# Altium footprint library 2.52-直插元件.PcbLib: 163 footprints (part 8 of 11)
Each footprint in its own frame and in the unit in brackets; x right, y up, seen from the top. Pads: shape width x height; smd on the part's side, far side on the other; paste and mask are expansions set on the pad; w line width, h text height; cw(c..) or ccw(c..) is an arc to the next point about the centre after c.
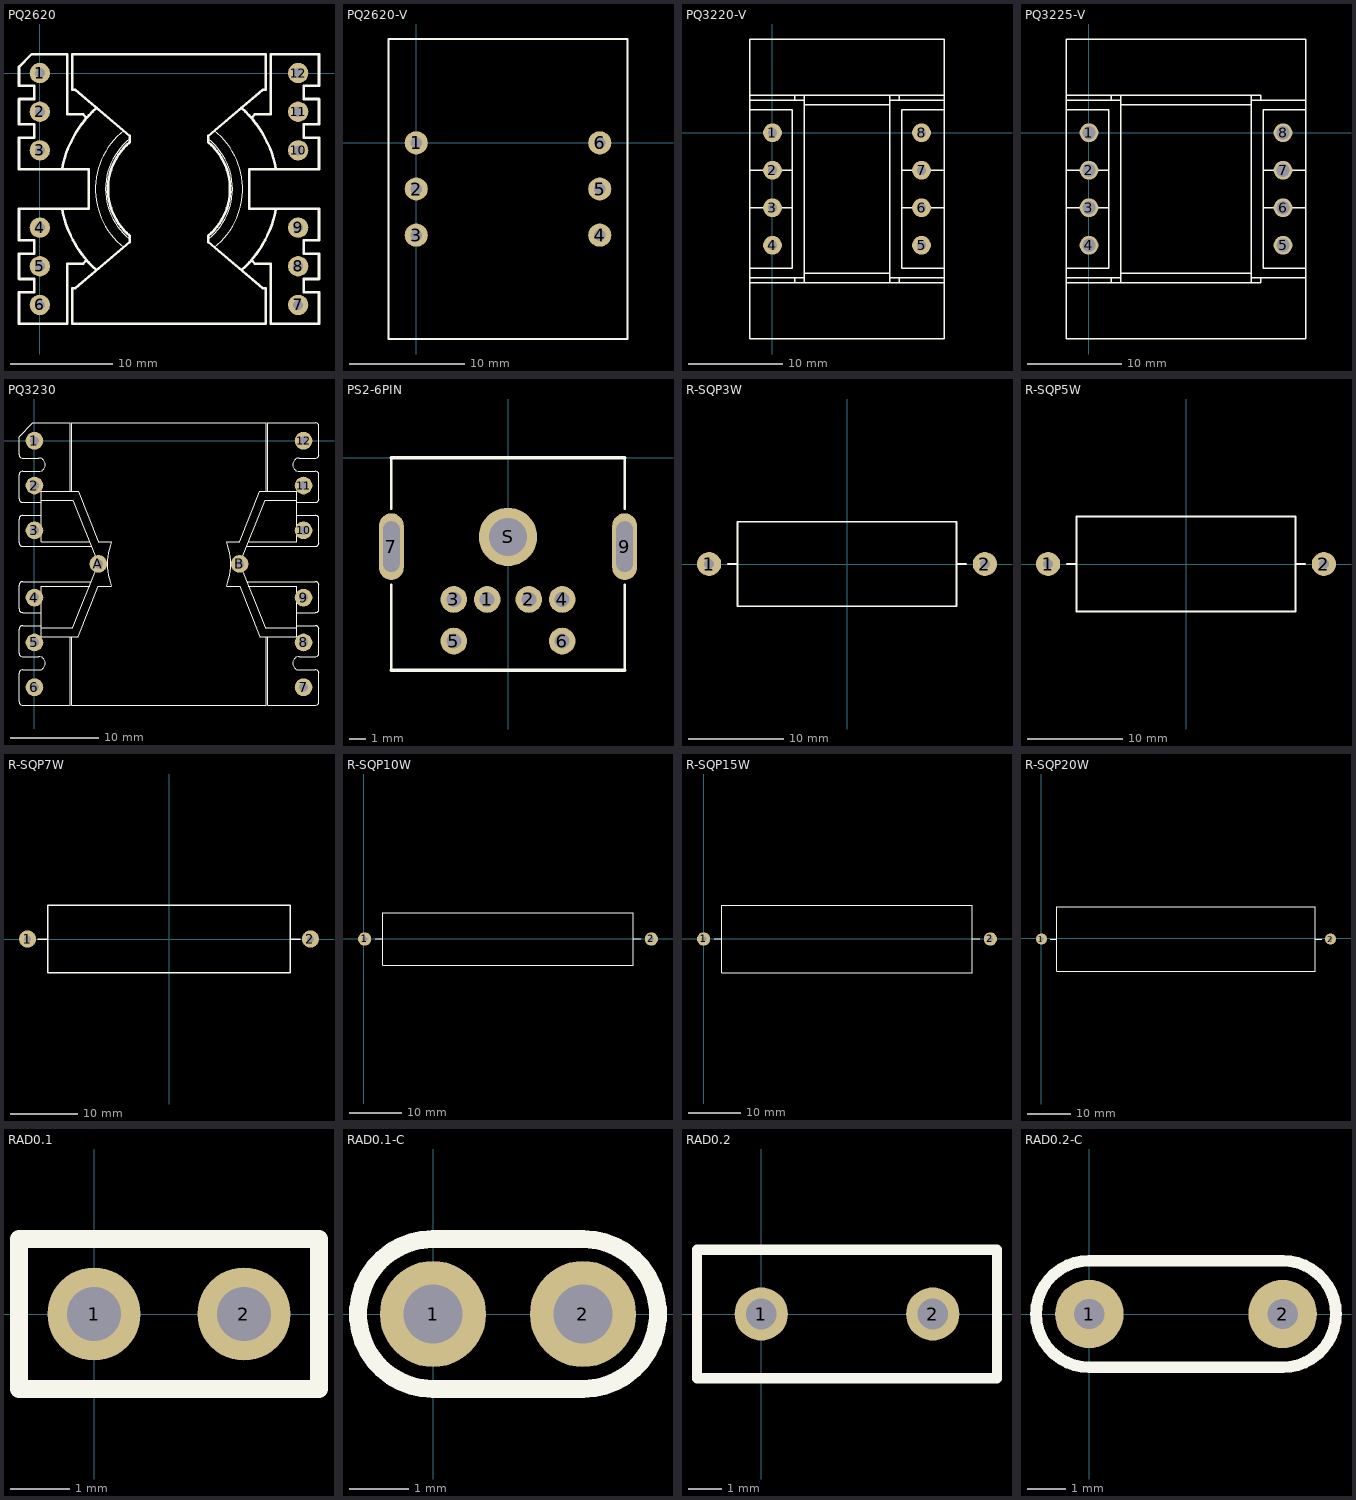
[diagram p7: the footprints below, top view; thin cyan lines are the x and y axes]

## PQ2620 [mm]
height 20.5
pads (12):
  round 2 hole 1: 1(0,0) 2(0,-3.8) 3(0,-7.6) 4(0,-15.2) 5(0,-19) 6(0,-22.8) 7(25.4,-22.8) 8(25.4,-19) 9(25.4,-15.2) 10(25.4,-7.6) 11(25.4,-3.8) 12(25.4,0)
Top Overlay:
  lines w0.1: 8.241,-17.117 cw(c12.7,-11.4) 8.249,-5.677 ; 8.838,-16.314 cw(c12.7,-11.4) 8.845,-6.48 ; 16.555,-6.48 cw(c12.7,-11.4) 16.562,-16.314 ; 17.151,-5.677 cw(c12.7,-11.4) 17.159,-17.117
  lines w0.254: 2.192,-13.418 ccw(c12.7,-11.4) 5.563,-19.372 ; 2.192,-9.382 cw(c12.7,-11.4) 5.578,-3.414 ; 4.609,-18.403 4.262,-18.75 2.7,-18.75 2.7,-24.65 -2.05,-24.65 -2.05,-21.55 -0.55,-21.55 -0.55,-20.25 -2.05,-20.25 -2.05,-17.75 -0.55,-17.75 -0.55,-16.45 -2.05,-16.45 -2.05,-13.35 4.8,-13.35 4.8,-9.45 -2.05,-9.45 -2.05,-6.35 -0.55,-6.35 -0.55,-5.05 -2.05,-5.05 -2.05,-2.55 -0.55,-2.55 -0.55,-1.25 -2.05,-1.25 -2.05,0.602 -0.802,1.85 2.7,1.85 2.7,-4.05 4.262,-4.05 4.609,-4.397 ; 8.843,-15.997 8.843,-16.617 3.5,-21.15 3.2,-21.15 3.2,-24.65 22.2,-24.65 22.2,-21.15 21.9,-21.15 16.556,-16.617 16.556,-15.997 ; 8.843,-15.996 cw(c12.7,-11.4) 8.843,-6.804 8.843,-6.183 ; 8.844,-6.183 3.5,-1.65 3.2,-1.65 3.2,1.85 22.2,1.85 22.2,-1.65 21.9,-1.65 16.557,-6.182 16.557,-6.803 cw(c12.7,-11.4) 16.557,-15.996 ; 19.822,-3.414 cw(c12.7,-11.4) 23.208,-9.382 ; 19.837,-19.372 ccw(c12.7,-11.4) 23.208,-13.418 ; 20.791,-18.403 21.138,-18.75 22.7,-18.75 22.7,-24.65 27.45,-24.65 27.45,-21.55 25.95,-21.55 25.95,-20.25 27.45,-20.25 27.45,-17.75 25.95,-17.75 25.95,-16.45 27.45,-16.45 27.45,-13.35 20.6,-13.35 20.6,-9.45 27.45,-9.45 27.45,-6.35 25.95,-6.35 25.95,-5.05 27.45,-5.05 27.45,-2.55 25.95,-2.55 25.95,-1.25 27.45,-1.25 27.45,1.85 22.7,1.85 22.7,-4.05 21.138,-4.05 20.791,-4.397
3D body "PQ-26.STEP": height 25.1, standoff -4.4, extent -1.41,-24.507 27.19,1.693

## PQ2620-V [mm]
height 20.5
pads (6):
  round 2 hole 1: 1(0,0) 2(0,-4) 3(0,-8) 4(15.9,-8) 5(15.9,-4) 6(15.9,0)
Top Overlay:
  lines w0.15: -2.4,-17 -2.4,9 18.3,9 18.3,-17 -2.4,-17
3D body "260_1_.STEP": height 26.9, standoff -4, extent -2.504,-16.937 18.296,9.063

## PQ3220-V [mm]
height 20.5
pads (8):
  round 2 hole 1: 1(0,0) 2(0,-4) 3(0,-8) 4(0,-12) 5(15.9,-12) 6(15.9,-8) 7(15.9,-4) 8(15.9,0)
Top Overlay:
  lines w0.15: -2.4,-16 18.3,-16 ; -2.4,-14.45 2.1,-14.45 2.1,2.45 -2.4,2.45 ; -2.4,-8 2.102,-8 ; -2.4,-4 2.1,-4 ; -2.4,4 18.3,4 ; -2.397,-15.45 3.4,-15.45 ; -2.397,3.45 3.4,3.45 ; 2.4,-16 2.4,-15.45 ; 2.4,3.45 2.4,4 ; 3.4,-16 3.4,-15.45 ; 3.4,-15 12.5,-15 ; 3.4,3 12.5,3 ; 3.4,4 3.4,3.45 ; 12.5,-16 12.5,-15.45 ; 12.5,4 12.5,3.45 ; 13.5,-16 13.5,-15.45 ; 13.5,3.45 13.5,4 ; 13.798,-8 18.3,-8 ; 13.8,-4 18.3,-4 ; 18.297,-15.45 12.5,-15.45 ; 18.297,3.45 12.5,3.45 ; 18.3,-14.45 13.8,-14.45 13.8,2.45 18.3,2.45 ; 3.4,-15.45 3.4,3.45 ; 12.5,-15.45 12.5,3.45 ; -2.4,-22 -2.4,10 18.3,10 18.3,-22 -2.4,-22
3D body "pq-32-2-2.STEP": height 29.88, standoff -3.82, extent -2.079,-21.82 17.921,9.88

## PQ3225-V [mm] "淘宝ID:黄晶宝石   店铺网址:https://shop463601444.taobao.com"
height 20.5
pads (8):
  round 2 hole 1.4: 1(0,0) 2(0,-4) 3(0,-8) 4(0,-12) 5(20.7,-12) 6(20.7,-8) 7(20.7,-4) 8(20.7,0)
Top Overlay:
  lines w0.15: -2.4,-16 18.3,-16 18.3,-15.45 ; -2.4,-14.45 2.1,-14.45 2.1,2.45 -2.4,2.45 ; -2.4,-8 2.102,-8 ; -2.4,-4 2.1,-4 ; -2.4,4 18.3,4 18.3,3.45 ; -2.397,-15.45 3.4,-15.45 ; -2.397,3.45 3.4,3.45 ; 2.4,-16 2.4,-15.45 ; 2.4,3.45 2.4,4 ; 3.4,-16 3.4,-15.45 ; 3.4,-15 17.295,-15 ; 3.4,3 17.298,3 ; 3.4,4 3.4,3.45 ; 17.3,-16 17.3,-15.45 ; 17.3,4 17.3,3.45 ; 18.598,-8 23.1,-8 ; 18.6,-4 23.1,-4 ; 23.097,-15.45 17.3,-15.45 ; 23.097,3.45 17.3,3.45 ; 23.1,-14.45 18.6,-14.45 18.6,2.45 23.1,2.45 ; 3.4,-15.45 3.4,3.45 ; 17.3,-15.45 17.3,3.45 ; -2.4,-22 23.1,-22 23.1,10 -2.4,10 -2.4,-22
3D body "PQ-32-2.STEP": height 29.8, standoff -3.82, extent -2.15,-21.85 22.85,9.85

## PQ3230 [mm]
height 20.5
pads (14):
  round 2 hole 1: 1(0,0) 2(0,-5.08) 3(0,-10.16) 4(0,-17.78) 5(0,-22.86) 6(0,-27.94) 7(30.5,-27.94) 8(30.5,-22.86) 9(30.5,-17.78) 10(30.5,-10.16) 11(30.5,-5.08) 12(30.5,0) A(7.25,-13.959) B(23.25,-13.959)
Top Overlay:
  lines w0.1: 4.05,-22.22 4.05,-29.97 -1.34,-29.97 cw(c-1.34,-29.56) -1.75,-29.56 -1.75,-26.38 cw(c-1.34,-26.38) -1.34,-25.97 0.5,-25.97 ccw(c0.5,-25.22) 0.5,-24.47 -1.34,-24.47 cw(c-1.34,-24.06) -1.75,-24.06 -1.75,-21.38 cw(c-1.34,-21.38) -1.34,-20.97 0.749,-20.97 0.749,-19.47 -1.34,-19.47 cw(c-1.34,-19.06) -1.75,-19.06 -1.75,-16.38 cw(c-1.34,-16.38) -1.34,-15.97 6.451,-15.97 ; 4.05,-5.72 4.05,2.03 -0.195,2.03 -1.75,0.475 -1.75,-1.56 ccw(c-1.34,-1.56) -1.34,-1.97 0.5,-1.97 cw(c0.5,-2.72) 0.5,-3.47 -1.34,-3.47 ccw(c-1.34,-3.88) -1.75,-3.88 -1.75,-6.56 ccw(c-1.34,-6.56) -1.34,-6.97 0.749,-6.97 0.749,-8.47 -1.34,-8.47 ccw(c-1.34,-8.88) -1.75,-8.88 -1.75,-11.56 ccw(c-1.34,-11.56) -1.34,-11.97 6.451,-11.97 ; 4.25,-22.22 4.25,-29.97 26.25,-29.97 26.25,-22.22 ; 4.25,-5.72 4.25,2.03 26.25,2.03 26.25,-5.72 ; 6.25,-16.47 0.75,-16.47 0.75,-21.22 ; 6.25,-11.47 0.75,-11.47 0.75,-6.72 ; 7.25,-13.981 4.341,-21.22 0.75,-21.22 ; 7.25,-13.959 4.341,-6.72 0.75,-6.72 ; 8.699,-16.47 7.25,-16.47 4.939,-22.22 0.75,-22.22 0.75,-21.22 ; 8.699,-11.47 7.25,-11.47 4.939,-5.72 0.75,-5.72 0.75,-6.72 ; 8.71,-16.466 cw(c15.25,-13.97) 8.71,-11.474 ; 21.79,-16.466 ccw(c15.25,-13.97) 21.79,-11.474 ; 21.801,-16.47 23.25,-16.47 25.561,-22.22 29.75,-22.22 29.75,-21.22 ; 21.801,-11.47 23.25,-11.47 25.561,-5.72 29.75,-5.72 29.75,-6.72 ; 23.25,-13.981 26.159,-21.22 29.75,-21.22 ; 23.25,-13.959 26.159,-6.72 29.75,-6.72 ; 24.049,-15.97 31.84,-15.97 cw(c31.84,-16.38) 32.25,-16.38 32.25,-19.06 cw(c31.84,-19.06) 31.84,-19.47 29.751,-19.47 29.751,-20.97 31.84,-20.97 cw(c31.84,-21.38) 32.25,-21.38 32.25,-24.06 cw(c31.84,-24.06) 31.84,-24.47 30,-24.47 ccw(c30,-25.22) 30,-25.97 31.84,-25.97 cw(c31.84,-26.38) 32.25,-26.38 32.25,-29.56 cw(c31.84,-29.56) 31.84,-29.97 26.45,-29.97 26.45,-22.22 ; 24.049,-11.97 31.84,-11.97 ccw(c31.84,-11.56) 32.25,-11.56 32.25,-8.88 ccw(c31.84,-8.88) 31.84,-8.47 29.751,-8.47 29.751,-6.97 31.84,-6.97 ccw(c31.84,-6.56) 32.25,-6.56 32.25,-3.88 ccw(c31.84,-3.88) 31.84,-3.47 30,-3.47 cw(c30,-2.72) 30,-1.97 31.84,-1.97 ccw(c31.84,-1.56) 32.25,-1.56 32.25,1.62 ccw(c31.84,1.62) 31.84,2.03 26.45,2.03 26.45,-5.72 ; 24.25,-16.47 29.75,-16.47 29.75,-21.22 ; 24.25,-11.47 29.75,-11.47 29.75,-6.72
3D body "pq-32.STEP": height 27.54, standoff -7.36, extent -1.671,-30.046 32.329,1.953

## PS2-6PIN [mm]
pads (9):
  round 1.6 hole 0.9: 1(-1.25,-8.5) 2(1.25,-8.5) 3(-3.25,-8.5) 4(3.25,-8.5) 5(-3.25,-11) 6(3.25,-11)
  oval 1.5x4 hole 1 slot 3.048 at 90 deg: 7(-7,-5.334) 9(7,-5.334)
  round 3.5 hole 2.3: S(0,-4.75)
Top Overlay:
  lines w0.152: -7,-12.75 -7,-7.62 ; -7,-3.048 -7,0 ; 7,-12.75 7,-7.62 ; 7,-3.048 7,0
  lines w0.2: -7,-12.75 7,-12.75 ; -7,0 7,0

## R-SQP3W [mm]
pads (2):
  round 2.54 hole 1.016: 1(-14.5,0) 2(14.5,0)
Top Overlay:
  lines w0.203: -12.5,0 -11.5,0 ; 11.5,0 12.5,0 ; -11.5,-4.445 -11.5,4.445 11.5,4.445 11.5,-4.445 -11.5,-4.445

## R-SQP5W [mm]
pads (2):
  round 2.54 hole 1.016: 1(-14.5,0) 2(14.5,0)
Top Overlay:
  lines w0.203: -12.5,0 -11.5,0 ; 11.5,0 12.5,0 ; -11.5,-5 -11.5,5 11.5,5 11.5,-5 -11.5,-5

## R-SQP7W [mm]
pads (2):
  round 2.54 hole 1.016: 1(-21,0) 2(21,0)
Top Overlay:
  lines w0.203: -19.5,0 -18,0 ; 18,0 19.5,0 ; -18,-5 -18,5 18,5 18,-5 -18,-5

## R-SQP10W [mil]
pads (2):
  round 100 hole 40: 1(4.82,-2.5) 2(2170.18,-2.5)
Top Overlay:
  lines w8: 83.56,-2.5 142.62,-2.5 ; 2032.38,-2.5 2091.44,-2.5 ; 142.62,-199.35 142.62,194.35 2032.38,194.35 2032.38,-199.35 142.62,-199.35

## R-SQP15W [mil]
pads (2):
  round 100 hole 40: 1(-0.18,-2.5) 2(2165.18,-2.5)
Top Overlay:
  lines w8: 78.56,-2.5 137.62,-2.5 ; 2027.38,-2.5 2086.44,-2.5 ; 137.62,-258.41 137.62,253.41 2027.38,253.41 2027.38,-258.41 137.62,-258.41

## R-SQP20W [mil]
pads (2):
  round 100 hole 40: 1(3.6,-5) 2(2641.4,-5)
Top Overlay:
  lines w8: 82.34,-5 141.4,-5 ; 2503.6,-5 2562.66,-5 ; 141.4,-300.28 141.4,290.28 2503.6,290.28 2503.6,-300.28 141.4,-300.28

## RAD0.1 [mil]
pads (2):
  round 62 hole 36: 1(0,0) 2(100,0)
Top Overlay:
  lines w12: -50,-50 -50,50 150,50 150,-50 -50,-50

## RAD0.1-C [mm]
pads (2):
  round 1.8 hole 1: 1(0,0) 2(2.54,0)
Top Overlay:
  lines w0.305: 0,-1.27 cw(c0,0) 0,1.27 2.54,1.27 cw(c2.54,0) 2.54,-1.27 0,-1.27

## RAD0.2 [mil]
pads (2):
  round 62 hole 36: 1(0,0) 2(200,0)
Top Overlay:
  lines w12: -75,-75 275,-75 275,75 -75,75 -75,-75

## RAD0.2-C [mm]
pads (2):
  round 1.8 hole 0.8: 1(0,0) 2(5.08,0)
Top Overlay:
  lines w0.305: 0,-1.403 cw(c0,0) 0,1.403 5.08,1.403 cw(c5.08,0) 5.08,-1.403 0,-1.403